# Altium footprint library Package_DFN_QFN.PcbLib: 557 footprints (part 34 of 35)
Each footprint in its own frame and in the unit in brackets; x right, y up, seen from the top. Pads: shape width x height; smd on the part's side, far side on the other; paste and mask are expansions set on the pad; w line width, h text height; cw(c..) or ccw(c..) is an arc to the next point about the centre after c.
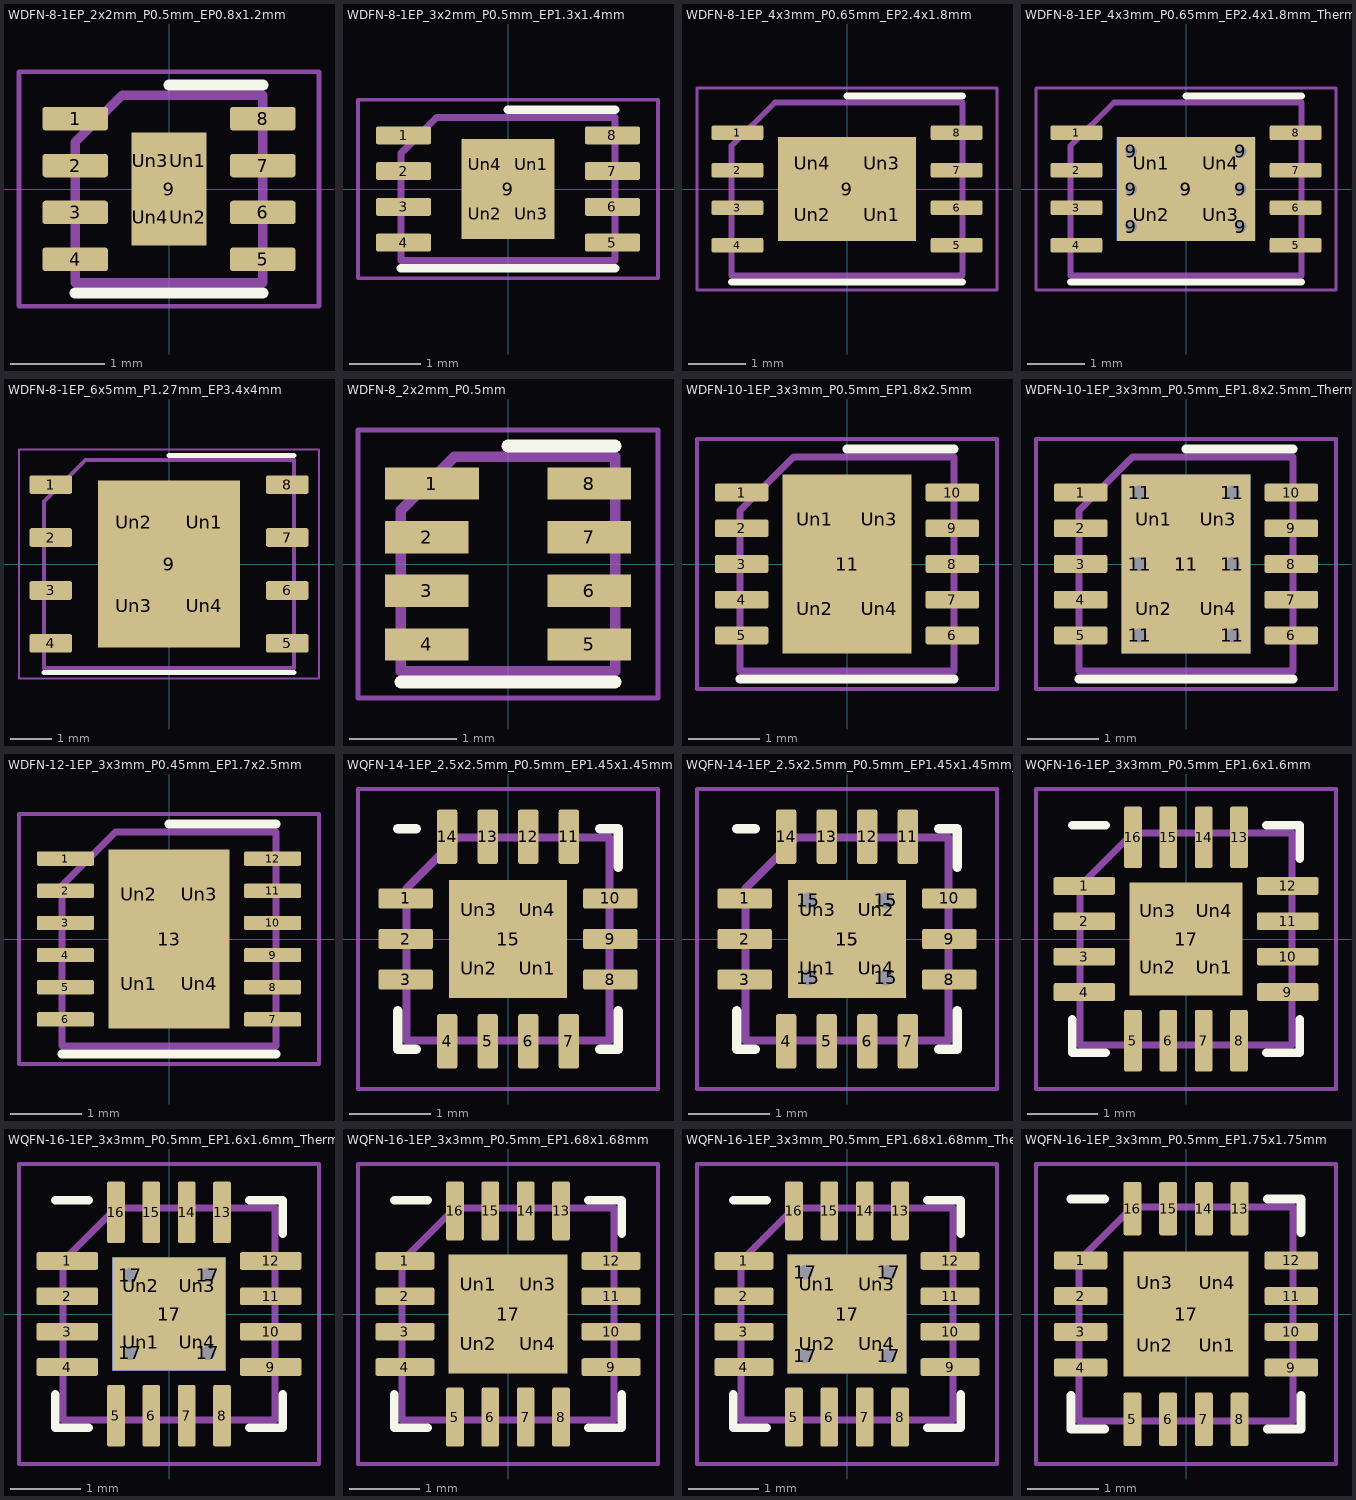
[diagram p33: the footprints below, top view; thin cyan lines are the x and y axes]

## WDFN-8-1EP_2x2mm_P0.5mm_EP0.8x1.2mm [mm]
pads (13):
  rrect25% 0.7x0.25 smd: 1(-1,0.75) 2(-1,0.25) 3(-1,-0.25) 4(-1,-0.75) 5(1,-0.75) 6(1,-0.25) 7(1,0.25) 8(1,0.75)
  rect 0.8x1.2 smd: 9(0,0)
  rrect25% 0.32x0.48 on Top Paste: Un1(0.2,0.3) Un2(0.2,-0.3) Un3(-0.2,0.3) Un4(-0.2,-0.3)
F.SilkS:
  lines w0.12: -1,-1.11 1,-1.11 ; 0,1.11 1,1.11
F.CrtYd:
  lines w0.05: -1.6,-1.25 1.6,-1.25 1.6,1.25 -1.6,1.25 -1.6,-1.25
F.Fab:
  lines w0.1: -1,-1 1,-1 1,1 -0.5,1 -1,0.5 -1,-1
  text "'.Designator'" at -2.028,-0.425 h0.5

## WDFN-8-1EP_3x2mm_P0.5mm_EP1.3x1.4mm [mm]
pads (13):
  rrect25% 0.775x0.25 smd: 1(-1.462,0.75) 2(-1.462,0.25) 3(-1.462,-0.25) 4(-1.462,-0.75) 5(1.462,-0.75) 6(1.462,-0.25) 7(1.462,0.25) 8(1.462,0.75)
  rect 1.3x1.4 smd: 9(0,0)
  rrect25% 0.52x0.56 on Top Paste: Un1(0.325,0.35) Un2(-0.325,-0.35) Un3(0.325,-0.35) Un4(-0.325,0.35)
F.SilkS:
  lines w0.12: -1.5,-1.11 1.5,-1.11 ; 0,1.11 1.5,1.11
F.CrtYd:
  lines w0.05: -2.1,-1.25 2.1,-1.25 2.1,1.25 -2.1,1.25 -2.1,-1.25
F.Fab:
  lines w0.1: -1.5,-1 1.5,-1 1.5,1 -1,1 -1.5,0.5 -1.5,-1
  text "'.Designator'" at -3.033,-0.628 h0.75

## WDFN-8-1EP_4x3mm_P0.65mm_EP2.4x1.8mm [mm]
pads (13):
  rrect25% 0.9x0.25 smd: 1(-1.9,0.975) 2(-1.9,0.325) 3(-1.9,-0.325) 4(-1.9,-0.975) 5(1.9,-0.975) 6(1.9,-0.325) 7(1.9,0.325) 8(1.9,0.975)
  rect 2.4x1.8 smd: 9(0,0)
  rrect25% 0.97x0.73 on Top Paste: Un1(0.6,-0.45) Un2(-0.6,-0.45) Un3(0.6,0.45) Un4(-0.6,0.45)
F.SilkS:
  lines w0.12: -2,-1.61 2,-1.61 ; 0,1.61 2,1.61
F.CrtYd:
  lines w0.05: -2.6,-1.75 -2.6,1.75 2.6,1.75 2.6,-1.75 -2.6,-1.75
F.Fab:
  lines w0.1: -2,-1.5 2,-1.5 2,1.5 -1.25,1.5 -2,0.75 -2,-1.5
  text "'.Designator'" at -4.047,-0.84 h1

## WDFN-8-1EP_4x3mm_P0.65mm_EP2.4x1.8mm_ThermalVias [mm]
pads (20):
  rrect25% 0.9x0.25 smd: 1(-1.9,0.975) 2(-1.9,0.325) 3(-1.9,-0.325) 4(-1.9,-0.975) 5(1.9,-0.975) 6(1.9,-0.325) 7(1.9,0.325) 8(1.9,0.975)
  round 0.5 hole 0.2: 9(-0.95,-0.65) 9(-0.95,0) 9(-0.95,0.65) 9(0.95,-0.65) 9(0.95,0) 9(0.95,0.65)
  rect 2.4x1.8 smd far side: 9(0,0)
  rect 2.4x1.8 smd: 9(0,0)
  rrect25% 0.97x0.73 on Top Paste: Un1(-0.6,0.45) Un2(-0.6,-0.45) Un3(0.6,-0.45) Un4(0.6,0.45)
F.SilkS:
  lines w0.12: -2,-1.61 2,-1.61 ; 0,1.61 2,1.61
F.CrtYd:
  lines w0.05: -2.6,-1.75 -2.6,1.75 2.6,1.75 2.6,-1.75 -2.6,-1.75
F.Fab:
  lines w0.1: -2,-1.5 -2,0.75 -1.25,1.5 2,1.5 2,-1.5 -2,-1.5
  text "'.Designator'" at -4.047,-0.84 h1

## WDFN-8-1EP_6x5mm_P1.27mm_EP3.4x4mm [mm]
pads (13):
  rrect25% 1.025x0.45 smd: 1(-2.838,1.905) 2(-2.838,0.635) 3(-2.838,-0.635) 4(-2.838,-1.905) 5(2.838,-1.905) 6(2.838,-0.635) 7(2.838,0.635) 8(2.838,1.905)
  rect 3.4x4 smd: 9(0,0)
  rrect18% 1.37x1.61 on Top Paste: Un1(0.85,1) Un2(-0.85,1) Un3(-0.85,-1) Un4(0.85,-1)
F.SilkS:
  lines w0.12: -3,-2.61 3,-2.61 ; 0,2.61 3,2.61
F.CrtYd:
  lines w0.05: -3.6,-2.75 3.6,-2.75 3.6,2.75 -3.6,2.75 -3.6,-2.75
F.Fab:
  lines w0.1: -3,-2.5 3,-2.5 3,2.5 -2,2.5 -3,1.5 -3,-2.5
  text "'.Designator'" at -4.047,-0.84 h1

## WDFN-8_2x2mm_P0.5mm [mm]
pads (8):
  rect 0.88x0.3 smd: 1(-0.71,0.75)
  rect 0.78x0.3 smd: 2(-0.76,0.25) 3(-0.76,-0.25) 4(-0.76,-0.75) 5(0.76,-0.75) 6(0.76,-0.25) 7(0.76,0.25) 8(0.76,0.75)
F.SilkS:
  lines w0.12: -1,-1.1 1,-1.1 ; 0,1.1 1,1.1
F.CrtYd:
  lines w0.05: -1.4,-1.25 -1.4,1.25 1.4,1.25 1.4,-1.25 -1.4,-1.25
F.Fab:
  lines w0.1: -1,-1 -1,0.5 -0.5,1 1,1 1,-1 -1,-1
  text "'.Designator'" at -2.048,-0.445 h0.5

## WDFN-10-1EP_3x3mm_P0.5mm_EP1.8x2.5mm [mm]
pads (15):
  rrect25% 0.75x0.25 smd: 1(-1.475,1) 2(-1.475,0.5) 3(-1.475,0) 4(-1.475,-0.5) 5(-1.475,-1) 6(1.475,-1) 7(1.475,-0.5) 8(1.475,0) 9(1.475,0.5) 10(1.475,1)
  rect 1.8x2.5 smd: 11(0,0)
  rrect25% 0.73x1.01 on Top Paste: Un1(-0.45,0.625) Un2(-0.45,-0.625) Un3(0.45,0.625) Un4(0.45,-0.625)
F.SilkS:
  lines w0.12: -1.5,-1.61 1.5,-1.61 ; 0,1.61 1.5,1.61
F.CrtYd:
  lines w0.05: -2.1,-1.75 -2.1,1.75 2.1,1.75 2.1,-1.75 -2.1,-1.75
F.Fab:
  lines w0.1: -1.5,-1.5 1.5,-1.5 1.5,1.5 -0.75,1.5 -1.5,0.75 -1.5,-1.5
  text "'.Designator'" at -3.033,-0.628 h0.75

## WDFN-10-1EP_3x3mm_P0.5mm_EP1.8x2.5mm_ThermalVias [mm]
pads (22):
  rrect25% 0.75x0.25 smd: 1(-1.475,1) 2(-1.475,0.5) 3(-1.475,0) 4(-1.475,-0.5) 5(-1.475,-1) 6(1.475,-1) 7(1.475,-0.5) 8(1.475,0) 9(1.475,0.5) 10(1.475,1)
  round 0.5 hole 0.2: 11(-0.65,-1) 11(-0.65,0) 11(-0.65,1) 11(0.65,-1) 11(0.65,0) 11(0.65,1)
  rect 1.8x2.5 smd: 11(0,0)
  rect 1.8x2.5 smd far side: 11(0,0)
  rrect25% 0.73x1.01 on Top Paste: Un1(-0.45,0.625) Un2(-0.45,-0.625) Un3(0.45,0.625) Un4(0.45,-0.625)
F.SilkS:
  lines w0.12: -1.5,-1.61 1.5,-1.61 ; 0,1.61 1.5,1.61
F.CrtYd:
  lines w0.05: -2.1,-1.75 -2.1,1.75 2.1,1.75 2.1,-1.75 -2.1,-1.75
F.Fab:
  lines w0.1: -1.5,-1.5 1.5,-1.5 1.5,1.5 -0.75,1.5 -1.5,0.75 -1.5,-1.5
  text "'.Designator'" at -3.033,-0.628 h0.75

## WDFN-12-1EP_3x3mm_P0.45mm_EP1.7x2.5mm [mm]
pads (17):
  rrect25% 0.8x0.2 smd: 1(-1.45,1.125) 2(-1.45,0.675) 3(-1.45,0.225) 4(-1.45,-0.225) 5(-1.45,-0.675) 6(-1.45,-1.125) 7(1.45,-1.125) 8(1.45,-0.675) 9(1.45,-0.225) 10(1.45,0.225) 11(1.45,0.675) 12(1.45,1.125)
  rect 1.7x2.5 smd: 13(0,0)
  rrect25% 0.69x1.01 on Top Paste: Un1(-0.425,-0.625) Un2(-0.425,0.625) Un3(0.425,0.625) Un4(0.425,-0.625)
F.SilkS:
  lines w0.12: -1.5,-1.61 1.5,-1.61 ; 0,1.61 1.5,1.61
F.CrtYd:
  lines w0.05: -2.1,-1.75 2.1,-1.75 2.1,1.75 -2.1,1.75 -2.1,-1.75
F.Fab:
  lines w0.1: -1.5,-1.5 1.5,-1.5 1.5,1.5 -0.75,1.5 -1.5,0.75 -1.5,-1.5
  text "'.Designator'" at -3.033,-0.628 h0.75

## WQFN-14-1EP_2.5x2.5mm_P0.5mm_EP1.45x1.45mm [mm]
pads (19):
  rrect25% 0.675x0.25 smd: 1(-1.262,0.5) 2(-1.262,0) 3(-1.262,-0.5) 8(1.262,-0.5) 9(1.262,0) 10(1.262,0.5)
  rrect25% 0.25x0.675 smd: 4(-0.75,-1.262) 5(-0.25,-1.262) 6(0.25,-1.262) 7(0.75,-1.262) 11(0.75,1.262) 12(0.25,1.262) 13(-0.25,1.262) 14(-0.75,1.262)
  rect 1.45x1.45 smd: 15(0,0)
  rrect25% 0.58x0.58 on Top Paste: Un1(0.36,-0.36) Un2(-0.36,-0.36) Un3(-0.36,0.36) Un4(0.36,0.36)
F.SilkS:
  lines w0.12: -1.36,-0.885 -1.36,-1.36 -1.135,-1.36 ; -1.36,1.36 -1.135,1.36 ; 1.135,-1.36 1.36,-1.36 1.36,-0.885 ; 1.135,1.36 1.36,1.36 1.36,0.885
F.CrtYd:
  lines w0.05: -1.85,-1.85 1.85,-1.85 1.85,1.85 -1.85,1.85 -1.85,-1.85
F.Fab:
  lines w0.1: -1.25,-1.25 1.25,-1.25 1.25,1.25 -0.625,1.25 -1.25,0.625 -1.25,-1.25
  text "'.Designator'" at -2.506,-0.518 h0.62

## WQFN-14-1EP_2.5x2.5mm_P0.5mm_EP1.45x1.45mm_ThermalVias [mm]
pads (24):
  rrect25% 0.675x0.25 smd: 1(-1.262,0.5) 2(-1.262,0) 3(-1.262,-0.5) 8(1.262,-0.5) 9(1.262,0) 10(1.262,0.5)
  rrect25% 0.25x0.675 smd: 4(-0.75,-1.262) 5(-0.25,-1.262) 6(0.25,-1.262) 7(0.75,-1.262) 11(0.75,1.262) 12(0.25,1.262) 13(-0.25,1.262) 14(-0.75,1.262)
  round 0.5 hole 0.2: 15(-0.475,-0.475) 15(-0.475,0.475) 15(0.475,-0.475) 15(0.475,0.475)
  rect 1.45x1.45 smd: 15(0,0)
  rect 1.45x1.45 smd far side: 15(0,0)
  rrect25% 0.61x0.61 on Top Paste: Un1(-0.36,-0.36) Un2(0.36,0.36) Un3(-0.36,0.36) Un4(0.36,-0.36)
F.SilkS:
  lines w0.12: -1.36,-0.885 -1.36,-1.36 -1.135,-1.36 ; -1.36,1.36 -1.135,1.36 ; 1.135,-1.36 1.36,-1.36 1.36,-0.885 ; 1.135,1.36 1.36,1.36 1.36,0.885
F.CrtYd:
  lines w0.05: -1.85,-1.85 -1.85,1.85 1.85,1.85 1.85,-1.85 -1.85,-1.85
F.Fab:
  lines w0.1: -1.25,-1.25 1.25,-1.25 1.25,1.25 -0.625,1.25 -1.25,0.625 -1.25,-1.25
  text "'.Designator'" at -2.506,-0.518 h0.62

## WQFN-16-1EP_3x3mm_P0.5mm_EP1.6x1.6mm [mm]
pads (21):
  rrect25% 0.875x0.25 smd: 1(-1.438,0.75) 2(-1.438,0.25) 3(-1.438,-0.25) 4(-1.438,-0.75) 9(1.438,-0.75) 10(1.438,-0.25) 11(1.438,0.25) 12(1.438,0.75)
  rrect25% 0.25x0.875 smd: 5(-0.75,-1.438) 6(-0.25,-1.438) 7(0.25,-1.438) 8(0.75,-1.438) 13(0.75,1.438) 14(0.25,1.438) 15(-0.25,1.438) 16(-0.75,1.438)
  rect 1.6x1.6 smd: 17(0,0)
  rrect25% 0.64x0.64 on Top Paste: Un1(0.4,-0.4) Un2(-0.4,-0.4) Un3(-0.4,0.4) Un4(0.4,0.4)
F.SilkS:
  lines w0.12: -1.61,-1.135 -1.61,-1.61 -1.135,-1.61 ; -1.61,1.61 -1.135,1.61 ; 1.135,-1.61 1.61,-1.61 1.61,-1.135 ; 1.135,1.61 1.61,1.61 1.61,1.135
F.CrtYd:
  lines w0.05: -2.12,-2.12 2.12,-2.12 2.12,2.12 -2.12,2.12 -2.12,-2.12
F.Fab:
  lines w0.1: -1.5,-1.5 -1.5,0.75 -0.75,1.5 1.5,1.5 1.5,-1.5 -1.5,-1.5
  text "'.Designator'" at -3.033,-0.628 h0.75

## WQFN-16-1EP_3x3mm_P0.5mm_EP1.6x1.6mm_ThermalVias [mm]
pads (26):
  rrect25% 0.875x0.25 smd: 1(-1.438,0.75) 2(-1.438,0.25) 3(-1.438,-0.25) 4(-1.438,-0.75) 9(1.438,-0.75) 10(1.438,-0.25) 11(1.438,0.25) 12(1.438,0.75)
  rrect25% 0.25x0.875 smd: 5(-0.75,-1.438) 6(-0.25,-1.438) 7(0.25,-1.438) 8(0.75,-1.438) 13(0.75,1.438) 14(0.25,1.438) 15(-0.25,1.438) 16(-0.75,1.438)
  round 0.5 hole 0.2: 17(-0.55,-0.55) 17(-0.55,0.55) 17(0.55,-0.55) 17(0.55,0.55)
  rect 1.6x1.6 smd far side: 17(0,0)
  rect 1.6x1.6 smd: 17(0,0)
  rrect25% 0.69x0.69 on Top Paste: Un1(-0.4,-0.4) Un2(-0.4,0.4) Un3(0.4,0.4) Un4(0.4,-0.4)
F.SilkS:
  lines w0.12: -1.61,-1.135 -1.61,-1.61 -1.135,-1.61 ; -1.61,1.61 -1.135,1.61 ; 1.135,-1.61 1.61,-1.61 1.61,-1.135 ; 1.135,1.61 1.61,1.61 1.61,1.135
F.CrtYd:
  lines w0.05: -2.12,-2.12 2.12,-2.12 2.12,2.12 -2.12,2.12 -2.12,-2.12
F.Fab:
  lines w0.1: -1.5,-1.5 1.5,-1.5 1.5,1.5 -0.75,1.5 -1.5,0.75 -1.5,-1.5
  text "'.Designator'" at -3.033,-0.628 h0.75

## WQFN-16-1EP_3x3mm_P0.5mm_EP1.68x1.68mm [mm]
pads (21):
  rrect25% 0.835x0.25 smd: 1(-1.458,0.75) 2(-1.458,0.25) 3(-1.458,-0.25) 4(-1.458,-0.75) 9(1.458,-0.75) 10(1.458,-0.25) 11(1.458,0.25) 12(1.458,0.75)
  rrect25% 0.25x0.835 smd: 5(-0.75,-1.458) 6(-0.25,-1.458) 7(0.25,-1.458) 8(0.75,-1.458) 13(0.75,1.458) 14(0.25,1.458) 15(-0.25,1.458) 16(-0.75,1.458)
  rect 1.68x1.68 smd: 17(0,0)
  rrect25% 0.68x0.68 on Top Paste: Un1(-0.42,0.42) Un2(-0.42,-0.42) Un3(0.42,0.42) Un4(0.42,-0.42)
F.SilkS:
  lines w0.12: -1.61,-1.135 -1.61,-1.61 -1.135,-1.61 ; -1.61,1.61 -1.135,1.61 ; 1.135,-1.61 1.61,-1.61 1.61,-1.135 ; 1.135,1.61 1.61,1.61 1.61,1.135
F.CrtYd:
  lines w0.05: -2.12,-2.12 -2.12,2.12 2.12,2.12 2.12,-2.12 -2.12,-2.12
F.Fab:
  lines w0.1: -1.5,-1.5 1.5,-1.5 1.5,1.5 -0.75,1.5 -1.5,0.75 -1.5,-1.5
  text "'.Designator'" at -3.033,-0.628 h0.75

## WQFN-16-1EP_3x3mm_P0.5mm_EP1.68x1.68mm_ThermalVias [mm]
pads (26):
  rrect25% 0.835x0.25 smd: 1(-1.458,0.75) 2(-1.458,0.25) 3(-1.458,-0.25) 4(-1.458,-0.75) 9(1.458,-0.75) 10(1.458,-0.25) 11(1.458,0.25) 12(1.458,0.75)
  rrect25% 0.25x0.835 smd: 5(-0.75,-1.458) 6(-0.25,-1.458) 7(0.25,-1.458) 8(0.75,-1.458) 13(0.75,1.458) 14(0.25,1.458) 15(-0.25,1.458) 16(-0.75,1.458)
  round 0.5 hole 0.2: 17(-0.59,-0.59) 17(-0.59,0.59) 17(0.59,-0.59) 17(0.59,0.59)
  rect 1.68x1.68 smd: 17(0,0)
  rect 1.68x1.68 smd far side: 17(0,0)
  rrect25% 0.73x0.73 on Top Paste: Un1(-0.42,0.42) Un2(-0.42,-0.42) Un3(0.42,0.42) Un4(0.42,-0.42)
F.SilkS:
  lines w0.12: -1.61,-1.135 -1.61,-1.61 -1.135,-1.61 ; -1.61,1.61 -1.135,1.61 ; 1.135,-1.61 1.61,-1.61 1.61,-1.135 ; 1.135,1.61 1.61,1.61 1.61,1.135
F.CrtYd:
  lines w0.05: -2.12,-2.12 -2.12,2.12 2.12,2.12 2.12,-2.12 -2.12,-2.12
F.Fab:
  lines w0.1: -1.5,-1.5 1.5,-1.5 1.5,1.5 -0.75,1.5 -1.5,0.75 -1.5,-1.5
  text "'.Designator'" at -3.033,-0.628 h0.75

## WQFN-16-1EP_3x3mm_P0.5mm_EP1.75x1.75mm [mm]
pads (21):
  rrect25% 0.75x0.25 smd: 1(-1.475,0.75) 2(-1.475,0.25) 3(-1.475,-0.25) 4(-1.475,-0.75) 9(1.475,-0.75) 10(1.475,-0.25) 11(1.475,0.25) 12(1.475,0.75)
  rrect25% 0.25x0.75 smd: 5(-0.75,-1.475) 6(-0.25,-1.475) 7(0.25,-1.475) 8(0.75,-1.475) 13(0.75,1.475) 14(0.25,1.475) 15(-0.25,1.475) 16(-0.75,1.475)
  rect 1.75x1.75 smd: 17(0,0)
  rrect25% 0.71x0.71 on Top Paste: Un1(0.44,-0.44) Un2(-0.44,-0.44) Un3(-0.44,0.44) Un4(0.44,0.44)
F.SilkS:
  lines w0.12: -1.61,-1.135 -1.61,-1.61 -1.135,-1.61 ; -1.61,1.61 -1.135,1.61 ; 1.135,-1.61 1.61,-1.61 1.61,-1.135 ; 1.135,1.61 1.61,1.61 1.61,1.135
F.CrtYd:
  lines w0.05: -2.1,-2.1 -2.1,2.1 2.1,2.1 2.1,-2.1 -2.1,-2.1
F.Fab:
  lines w0.1: -1.5,-1.5 -1.5,0.75 -0.75,1.5 1.5,1.5 1.5,-1.5 -1.5,-1.5
  text "'.Designator'" at -3.033,-0.628 h0.75